# Altium footprint library Ixora.PcbLib: 191 footprints (part 6 of 12)
Each footprint in its own frame and in the unit in brackets; x right, y up, seen from the top. Pads: shape width x height; smd on the part's side, far side on the other; paste and mask are expansions set on the pad; w line width, h text height; cw(c..) or ccw(c..) is an arc to the next point about the centre after c.
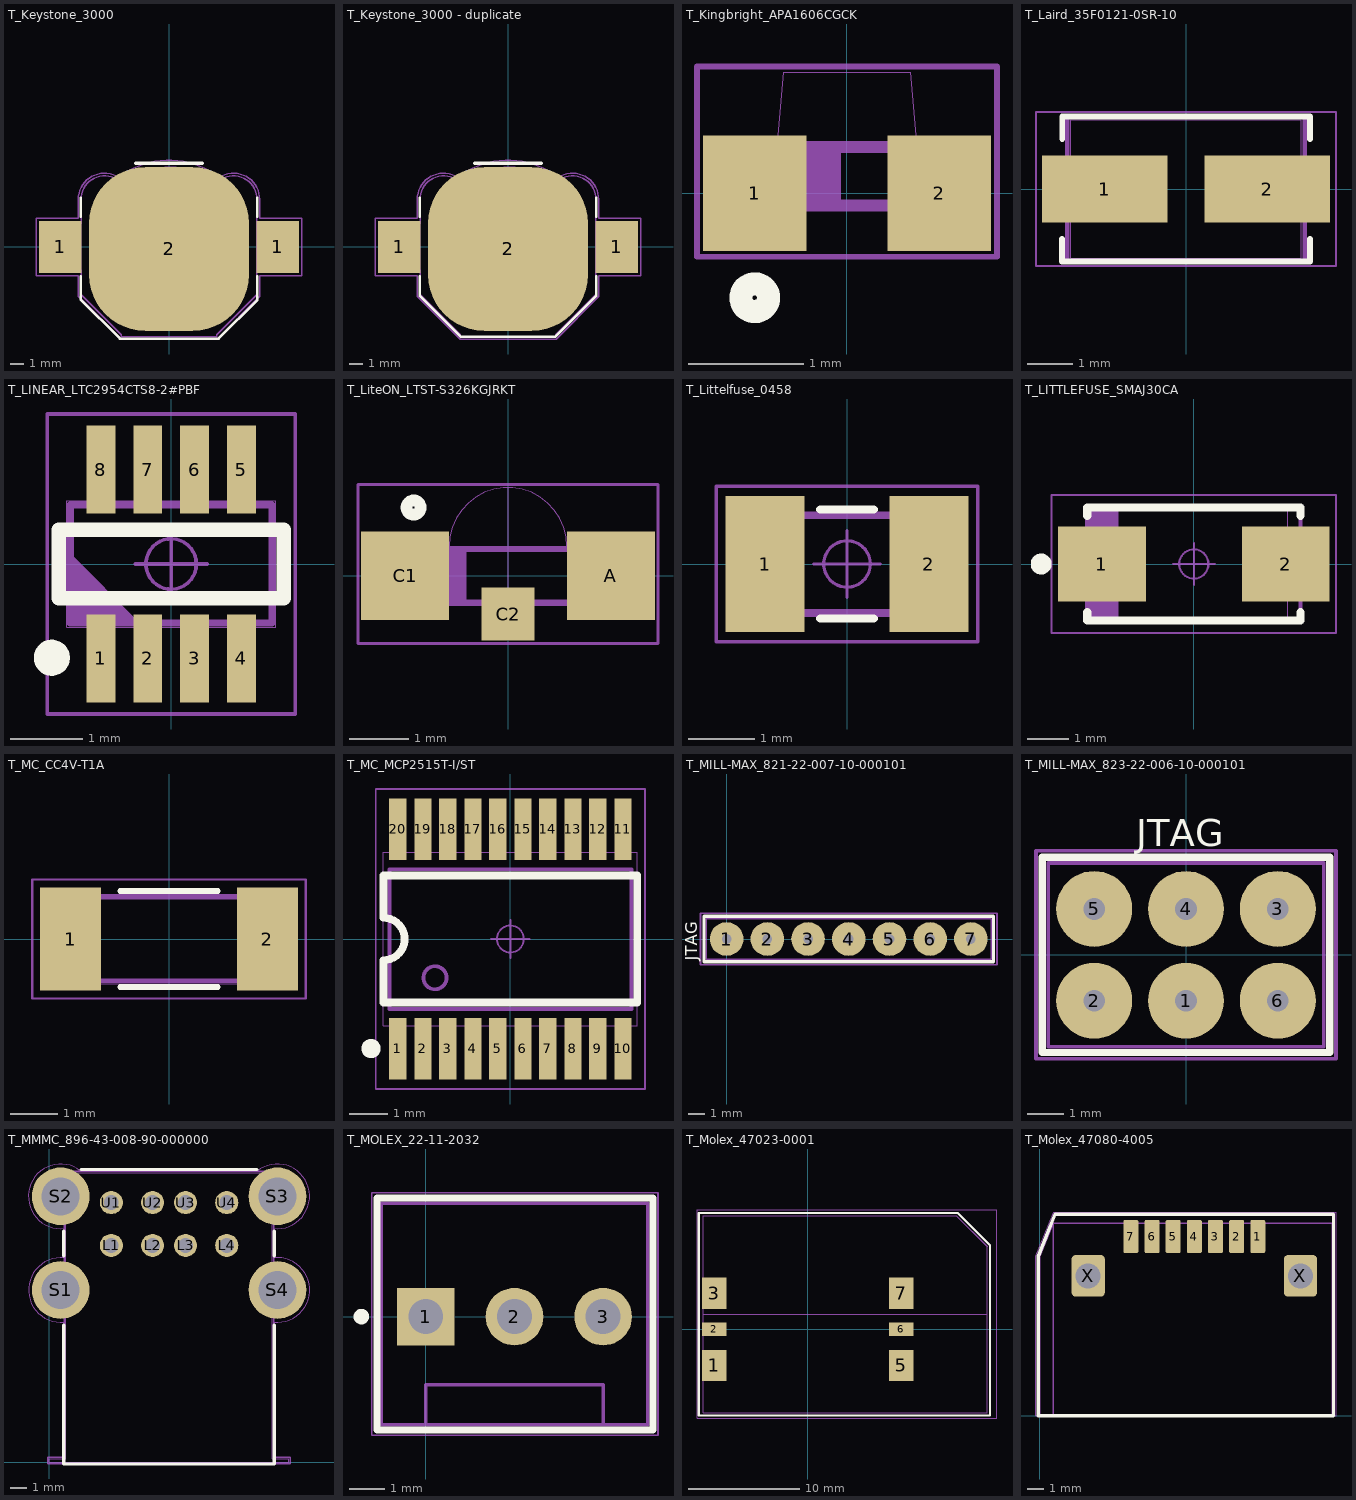
[diagram p5: the footprints below, top view; thin cyan lines are the x and y axes]

## T_Keystone_3000 [mm] "Battery Holder, 12mm (Dia)"
height 3.18
pads (3):
  rect 3.2x3.9 smd: 1(-8.17,0) 1(8.17,0)
  rrect70% 12x12.3 smd paste-11: 2(0,-0.15)
Top Overlay:
  lines w0.2: -6.631,-2.21 -6.631,-3.935 -3.683,-6.883 3.523,-6.883 3.734,-6.883 6.631,-3.986 6.631,-2.21 ; -6.631,2.261 -6.631,3.689 ; 6.631,2.261 6.631,3.689
  lines w0.254: -2.5,6.3 2.5,6.3
Mechanical 1:
  lines w0.1: -6.808,3.568 cw(c-4.849,3.588) -3.782,5.231 ; -6.808,3.588 -6.808,2.159 -9.982,2.159 -9.982,-2.159 -6.807,-2.159 -6.807,-3.683 -3.581,-6.909 3.607,-6.909 6.833,-3.683 6.833,-2.159 9.982,-2.159 9.982,2.159 6.809,2.159 6.809,3.57 ; -3.785,5.233 cw(c0,0.323) 3.785,5.233 ; 3.782,5.231 cw(c4.849,3.588) 6.807,3.568
Mechanical 2:
  circle w0.001: c0,0 r6
  circle w0.001: c8.185,0 r1.2
  circle w0.001: c-8.185,0 r1.2
  lines w0.001: -6.605,-1.585 -9.46,-1.585 -9.46,1.585 -6.605,1.585 ; -6.605,3.588 -6.605,-3.57 -6.59,-3.57 -3.57,-6.59 -3.57,-6.725 3.57,-6.725 3.57,-6.59 6.59,-3.57 6.605,-3.57 6.605,3.588 ; -6.605,3.57 cw(c-4.849,3.588) -3.585,4.808 ccw(c0,9.619) 3.586,4.808 cw(c4.849,3.588) 6.605,3.57 ; 6.605,-1.585 9.46,-1.585 9.46,1.585 6.605,1.585
Mechanical 3:
  lines w0.1: -6.605,-1.723 -6.605,-3.57 -6.59,-3.57 -3.57,-6.59 -3.57,-6.725 3.57,-6.725 3.57,-6.59 6.59,-3.57 6.605,-3.57 6.605,-1.723 ; -6.604,-1.723 -9.578,-1.723 -9.578,1.727 -6.605,1.727 -6.605,3.57 cw(c-4.849,3.588) -3.585,4.808 ccw(c0,9.619) 3.586,4.808 cw(c4.849,3.588) 6.605,3.57 ; 6.604,-1.724 9.575,-1.724 9.575,1.73 6.605,1.73 ; 6.605,1.727 6.605,3.57
3D body: height 3.16, standoff -0.01, extent -9.474,-6.923 9.474,5.142

## T_Keystone_3000 - duplicate [mm] "Battery Holder, 12mm (Dia)"
height 3.18
pads (3):
  rect 3.2x3.9 smd: 1(-8.17,0) 1(8.17,0)
  rrect70% 12x12.3 smd paste-11: 2(0,-0.15)
Top Overlay:
  lines w0.2: -6.631,-2.21 -6.631,-3.638 -3.517,-6.752 3.523,-6.752 3.523,-6.746 6.631,-3.638 6.631,-2.21 ; -6.631,2.261 -6.631,3.689 ; 6.631,2.261 6.631,3.689
  lines w0.254: -2.5,6.3 2.5,6.3
Mechanical 1:
  lines w0.1: -6.808,3.568 cw(c-4.849,3.588) -3.782,5.231 ; -6.808,3.588 -6.808,2.159 -9.982,2.159 -9.982,-2.159 -6.807,-2.159 -6.807,-3.683 -3.581,-6.909 3.607,-6.909 6.833,-3.683 6.833,-2.159 9.982,-2.159 9.982,2.159 6.809,2.159 6.809,3.57 ; -3.785,5.233 cw(c0,0.323) 3.785,5.233 ; 3.782,5.231 cw(c4.849,3.588) 6.807,3.568
Mechanical 2:
  circle w0.001: c-8.185,0 r1.2
  circle w0.001: c8.185,0 r1.2
  circle w0.001: c0,0 r6
  lines w0.001: -6.605,-1.585 -9.46,-1.585 -9.46,1.585 -6.605,1.585 ; -6.605,3.588 -6.605,-3.57 -6.59,-3.57 -3.57,-6.59 -3.57,-6.725 3.57,-6.725 3.57,-6.59 6.59,-3.57 6.605,-3.57 6.605,3.588 ; -6.605,3.57 cw(c-4.849,3.588) -3.585,4.808 ccw(c0,9.619) 3.586,4.808 cw(c4.849,3.588) 6.605,3.57 ; -3.57,5.345 3.57,5.345 ; 6.605,-1.585 9.46,-1.585 9.46,1.585 6.605,1.585
Mechanical 3:
  lines w0.1: -6.605,-1.723 -6.605,-3.57 -6.59,-3.57 -3.57,-6.59 -3.57,-6.725 3.57,-6.725 3.57,-6.59 6.59,-3.57 6.605,-3.57 6.605,-1.723 ; -6.604,-1.723 -9.578,-1.723 -9.578,1.727 -6.605,1.727 -6.605,3.57 cw(c-4.849,3.588) -3.585,4.808 ccw(c0,9.619) 3.586,4.808 cw(c4.849,3.588) 6.605,3.57 ; 6.604,-1.724 9.575,-1.724 9.575,1.73 6.605,1.73 ; 6.605,1.727 6.605,3.57
3D body: height 3.16, standoff -0.01, extent -9.474,-6.72 9.474,5.345

## T_Kingbright_APA1606CGCK [mm] "LED Kingbright APA1606CGCK Green"
height 0.6
pads (2):
  rect 0.9x1 smd: 1(-0.8,0) 2(0.8,0)
Top Overlay:
  circle w0.2: c-0.8,-0.905 r0.12
Mechanical 1:
  lines w0.05: -1.3,-0.55 1.3,-0.55 1.3,1.1 -1.3,1.1 -1.3,-0.55
Mechanical 2:
  lines w0.01: -0.6,0.45 -0.55,1.05 0.55,1.05 0.6,0.45 ; -0.9,-0.15 0.9,-0.15 0.9,0.45 -0.9,0.45 -0.9,-0.15
Mechanical 3:
  lines w0.1: -0.7,-0.105 -0.7,0.4 ; -0.6,-0.105 -0.6,0.4 ; -0.5,-0.105 -0.5,0.4 ; -0.4,-0.105 -0.4,0.4 ; -0.3,-0.105 -0.3,0.4 ; -0.2,-0.105 -0.2,0.4 ; -0.1,-0.105 -0.1,0.4 ; -0.8,-0.105 0.8,-0.105 0.8,0.4 -0.8,0.4 ; -0.8,-0.105 -0.8,0.4 ; -0.8,-0.105 -0.8,0.4
3D body: height 0.55, standoff 0, extent -0.6,0.45 0.6,1.05
3D body: height 0.6, standoff 0, extent -0.9,-0.15 0.9,0.45

## T_Laird_35F0121-0SR-10 [mm] "Power supply FB 10A"
height 3.05
pads (2):
  rect 2.77x1.47 smd: 1(-1.79,0) 2(1.79,0)
Top Overlay:
  lines w0.127: -2.732,-1.102 -2.732,-1.599 2.73,-1.599 2.73,-1.104 ; -2.729,1.104 -2.729,1.599 2.73,1.599 2.73,1.104
Mechanical 1:
  lines w0.05: -3.306,-1.695 -3.306,1.695 3.305,1.695 3.305,-1.695 -3.306,-1.695
Mechanical 2:
  lines w0.001: -2.54,-1.525 -2.54,1.525 2.54,1.525 2.54,-1.525 -2.54,-1.525
Mechanical 3:
  lines w0.1: -2.614,-1.599 2.614,-1.599 2.614,1.599 -2.614,1.599 -2.614,-1.599
3D body: height 3.05, standoff 0, extent -2.54,-1.525 2.54,1.525

## T_LINEAR_LTC2954CTS8-2#PBF [mm]
height 1
pads (8):
  rect 0.4x1.22 smd: 1(-0.975,-1.31) 2(-0.325,-1.31) 3(0.325,-1.31) 4(0.975,-1.31) 5(0.975,1.31) 6(0.325,1.31) 7(-0.325,1.31) 8(-0.975,1.31)
Top Overlay:
  circle w0.25: c-1.655,-1.3 r0.125
  lines w0.2: -1.56,-0.475 1.56,-0.475 1.56,0.475 -1.56,0.475 -1.56,-0.475
Mechanical 1:
  circle w0.05: c0,0 r0.35
  lines w0.05: -1.72,-2.08 1.72,-2.08 ; -1.72,-2.07 -1.72,2.08 1.72,2.08 1.72,-2.07 ; -0.5,0 0.5,0 ; 0,-0.5 0,0.5
Mechanical 2:
  lines w0.001: -1.45,-0.875 -1.45,0.875 1.45,0.875 1.45,-0.875 -1.45,-0.875
Mechanical 3:
  lines w0.1: -1.4,-0.72 -1.3,-0.82 ; -1.4,-0.62 -1.2,-0.82 ; -1.4,-0.52 -1.1,-0.82 ; -1.4,-0.42 -1,-0.82 ; -1.4,-0.32 -0.9,-0.82 ; -1.4,-0.22 -0.8,-0.82 ; -1.4,-0.12 -0.7,-0.82 ; -1.4,-0.02 -0.6,-0.82 ; -1.4,0.08 -0.5,-0.82 ; -1.4,-0.82 1.4,-0.82 1.4,0.82 -1.4,0.82 -1.4,-0.82
3D body: height 1, standoff 0, extent -1.45,-0.875 1.45,0.875

## T_LiteON_LTST-S326KGJRKT [mm] "LED LiteON LTST-S326KGJRKT Red Green"
height 1
pads (3):
  rect 1.5x1.5 smd: A(1.75,0) C1(-1.75,0)
  rect 0.9x0.9 smd: C2(0,-0.65)
Top Overlay:
  circle w0.2: c-1.605,1.16 r0.12
Mechanical 1:
  lines w0.05: -2.55,-1.15 2.55,-1.15 2.55,1.55 -2.55,1.55 -2.55,-1.15
Mechanical 2:
  lines w0.01: -1,0.5 cw(c0,0.5) 1,0.5 ; 0,-0.5 0,1.5 ; -1.5,-0.5 1.5,-0.5 1.5,0.5 -1.5,0.5 -1.5,-0.5
Mechanical 3:
  lines w0.1: -1.355,-0.455 -1.355,0.455 ; -1.255,-0.455 -1.255,0.455 ; -1.155,-0.455 -1.155,0.455 ; -1.055,-0.455 -1.055,0.455 ; -0.955,-0.455 -0.955,0.455 ; -0.855,-0.455 -0.855,0.455 ; -0.755,-0.455 -0.755,0.455 ; -1.455,-0.455 -1.455,0.455 ; -1.455,-0.455 -1.455,0.455 ; -1.455,-0.455 1.455,-0.455 1.455,0.455 -1.455,0.455
3D body: height 0.9, standoff 0, extent 0,0.5 1,1.5
3D body: height 1, standoff 0, extent 0,-0.5 1.5,0.5
3D body: height 0.9, standoff 0, extent -1,0.5 0,1.5
3D body: height 1, standoff 0, extent -1.5,-0.5 0,0.5

## T_Littelfuse_0458 [mm] "Fast Fuse"
height 1.575
pads (2):
  rect 1.185x2.05 smd: 1(-1.232,0) 2(1.232,0)
Top Overlay:
  lines w0.127: -0.4,-0.82 0.4,-0.82 ; -0.4,0.82 0.4,0.82
Mechanical 1:
  circle w0.05: c0,0 r0.35
  lines w0.05: -0.5,0 0.5,0 ; 0,-0.5 0,0.5 ; -1.97,-1.17 -1.97,1.17 1.97,1.17 1.97,-1.17 -1.97,-1.17
Mechanical 2:
  lines w0.01: -0.685,-0.787 -0.685,0.787 ; 0.685,-0.787 0.685,0.787 ; -1.587,-0.787 -1.587,0.787 1.587,0.787 1.587,-0.787 -1.587,-0.787
Mechanical 3:
  lines w0.1: -1.53,-0.73 -1.53,0.73 1.53,0.73 1.53,-0.73 -1.53,-0.73
3D body: height 1.58, standoff 0, extent -1.587,-0.787 -0.795,0.79
3D body: height 1.4, standoff 0, extent -0.795,-0.68 0.795,0.68
3D body: height 1.58, standoff 0, extent 0.795,-0.79 1.587,0.787

## T_LITTLEFUSE_SMAJ30CA [mm] "Bidirectional ESD protection"
height 2.29
pads (2):
  rect 2.1x1.8 smd: 1(-2.2,0) 2(2.2,0)
Top Overlay:
  circle w0.25: c-3.65,0 r0.125
  lines w0.2: -2.55,-1.15 -2.55,-1.35 2.55,-1.35 2.55,-1.15 ; -2.55,1.15 -2.55,1.35 2.55,1.35 2.55,1.15
Mechanical 1:
  circle w0.05: c0,0 r0.35
  lines w0.05: -0.5,0 0.5,0 ; 0,-0.5 0,0.5 ; -3.4,-1.65 3.4,-1.65 3.4,1.65 -3.4,1.65 -3.4,-1.65
Mechanical 2:
  lines w0.001: -2.25,-1.395 2.25,-1.395 2.25,1.395 -2.25,1.395 -2.25,-1.395
Mechanical 3:
  lines w0.1: -2.452,-1.332 -2.452,1.332 ; -2.352,-1.332 -2.352,1.332 ; -2.252,-1.332 -2.252,1.332 ; -2.152,-1.332 -2.152,1.332 ; -2.052,-1.332 -2.052,1.332 ; -1.952,-1.332 -1.952,1.332 ; -1.852,-1.332 -1.852,1.332 ; -2.552,-1.332 2.552,-1.332 2.552,1.332 -2.552,1.332 ; -2.552,-1.332 -2.552,1.332 ; -2.552,-1.332 -2.552,1.332
3D body: height 2.29, standoff 0, extent -2.25,-1.395 2.25,1.395

## T_MC_CC4V-T1A [mm]
height 0.9
pads (2):
  rect 1.3x2.2 smd: 1(-2.1,0) 2(2.1,0)
Top Overlay:
  lines w0.127: -1.04,-1.02 1.04,-1.02 ; -1.04,1.02 1.04,1.02
Mechanical 1:
  lines w0.05: -2.92,-1.27 2.92,-1.27 2.92,1.27 -2.92,1.27 -2.92,-1.27
Mechanical 2:
  lines w0.001: -2.5,-0.95 2.5,-0.95 2.5,0.95 -2.5,0.95 -2.5,-0.95
Mechanical 3:
  lines w0.1: -2.44,-0.89 -2.44,0.89 2.44,0.89 2.44,-0.89 -2.44,-0.89
3D body: height 2.29, standoff 0, extent -2.5,-0.95 2.5,0.95

## T_MC_MCP2515T-I/ST [mm] "TSSOP20"
height 1.2
pads (20):
  rect 0.45x1.6 smd: 1(-2.925,-2.85) 2(-2.275,-2.85) 3(-1.625,-2.85) 4(-0.975,-2.85) 5(-0.325,-2.85) 6(0.325,-2.85) 7(0.975,-2.85) 8(1.625,-2.85) 9(2.275,-2.85) 10(2.925,-2.85) 11(2.925,2.85) 12(2.275,2.85) 13(1.625,2.85) 14(0.975,2.85) 15(0.325,2.85) 16(-0.325,2.85) 17(-0.975,2.85) 18(-1.625,2.85) 19(-2.275,2.85) 20(-2.925,2.85)
Top Overlay:
  circle w0.25: c-3.625,-2.85 r0.125
  lines w0.2: -3.3,-1.65 -3.3,-0.55 ccw(c-3.3,0) -3.3,0.55 -3.3,1.65 3.3,1.65 3.3,-1.65 -3.3,-1.65
Mechanical 1:
  circle w0.05: c0,0 r0.35
  lines w0.05: -0.5,0 0.5,0 ; 0,-0.5 0,0.5 ; -3.5,-3.9 -3.5,3.9 3.5,3.9 3.5,-3.9 -3.5,-3.9
Mechanical 2:
  lines w0.001: -3.3,-2.25 -3.3,2.25 3.3,2.25 3.3,-2.25 -3.3,-2.25
Mechanical 3:
  circle w0.1: c-1.961,-1.008 r0.3
  lines w0.1: -3.143,-1.817 -3.143,1.815 3.147,1.815 3.147,-1.817 -3.143,-1.817
3D body: height 1.2, standoff 0, extent -3.3,-2.25 3.3,2.25

## T_MILL-MAX_821-22-007-10-000101 [mm] "Pogo Pins"
height 3.48
pads (7):
  round 2.1 hole 0.6: 1(0,0) 2(2.54,0) 3(5.08,0) 4(7.62,0) 5(10.16,0) 6(12.7,0) 7(15.24,0)
Top Overlay:
  lines w0.2: -1.42,-1.42 -1.42,1.42 16.66,1.42 16.66,-1.42 -1.42,-1.42
  text "JTAG" at -1.85,-1.35 h0.75
Mechanical 1:
  lines w0.1: -1.63,-1.6 -1.63,1.6 16.87,1.6 16.87,-1.6 -1.63,-1.6
Mechanical 2:
  lines w0.01: -1.27,-1.27 16.51,-1.27 16.51,1.27 -1.27,1.27 -1.27,-1.27
Mechanical 3:
  lines w0.1: -1.27,-1.27 -1.27,1.27 16.51,1.27 16.51,-1.27 -1.27,-1.27
3D body: height 3.5, standoff -1.74, extent -1.27,-1.27 16.51,1.27

## T_MILL-MAX_823-22-006-10-000101 [mm] "Pogo Pins"
height 3.48
pads (6):
  round 2.1 hole 0.6: 1(0,-1.27) 2(-2.54,-1.27) 3(2.54,1.27) 4(0,1.27) 5(-2.54,1.27) 6(2.54,-1.27)
Top Overlay:
  lines w0.2: -3.975,-2.7 -3.975,2.7 3.975,2.7 3.975,-2.7 -3.975,-2.7
  text "JTAG" at -1.375,3 h0.75
Mechanical 1:
  lines w0.1: -4.15,-2.875 -4.15,2.875 4.15,2.875 4.15,-2.875 -4.15,-2.875
Mechanical 2:
  lines w0.001: -3.81,-2.54 -3.81,2.54 3.81,2.54 3.81,-2.54 -3.81,-2.54
Mechanical 3:
  lines w0.1: -3.81,-2.54 -3.81,2.54 3.81,2.54 3.81,-2.54 -3.81,-2.54
3D body: height 3.5, standoff -1.74, extent -3.81,-2.54 3.81,2.54

## T_MMMC_896-43-008-90-000000 [mm] "USB 2.0 double row, Type A"
height 15.6
pads (12):
  round 1.4 hole 0.9: L1(3.75,13.13) L2(6.25,13.13) L3(8.25,13.13) L4(10.75,13.13) U1(3.75,15.73) U2(6.25,15.73) U3(8.25,15.73) U4(10.75,15.73)
  round 3.5 hole 2.3: S1(0.68,10.43) S2(0.68,16.11) S3(13.82,16.11) S4(13.82,10.43)
Top Overlay:
  lines w0.2: 0.875,8.3 0.875,-0.12 13.625,-0.12 13.625,8.3 ; 0.875,12.5 0.875,14 ; 1.91,17.73 12.58,17.73 ; 13.625,12.5 13.625,14
Mechanical 1:
  lines w0.05: 0.901,8.484 0.901,0.299 -0.099,0.299 -0.099,-0.099 14.599,-0.099 14.599,0.299 13.599,0.299 13.599,8.485 ; 0.901,12.374 0.901,14.164 ; 0.902,8.484 cw(c0.685,10.429) 0.904,12.374 ; 0.903,14.164 cw(c0.679,16.109) 1.895,17.643 1.91,17.628 12.582,17.628 ; 12.582,17.631 cw(c13.815,16.11) 13.598,14.165 ; 13.599,12.375 13.599,14.165 ; 13.599,12.376 cw(c13.815,10.43) 13.6,8.485
Mechanical 2:
  lines w0.001: 0,0 14.5,0 14.5,0.2 13.5,0.2 13.5,17.53 1,17.53 1,0.2 0,0.2 0,0
Mechanical 3:
  lines w0.1: 0.9,0.299 0.9,17.629 13.599,17.629 13.599,0.299 14.6,0.299 14.6,-0.099 -0.099,-0.099 -0.099,0.299 0.901,0.299
3D body: height 16.17, standoff -3.58, extent -0.45,0 14.95,17.53

## T_MOLEX_22-11-2032 [mm] "Connector; Header; 3 Position with Friction Lock"
height 10
pads (3):
  rect 1.65x1.65 hole 1: 1(0,0)
  round 1.65 hole 1: 2(2.54,0) 3(5.08,0)
Top Overlay:
  circle w0.254: c-1.845,0 r0.095
  lines w0.2: -1.4,-3.25 6.5,-3.25 6.5,3.4 -1.4,3.4 -1.4,-3.25
Mechanical 1:
  lines w0.05: -1.55,-3.4 6.65,-3.4 6.65,3.55 -1.55,3.55 -1.55,-3.4
Mechanical 2:
  lines w0.001: -1.27,-3.099 6.35,-3.099 6.35,3.251 -1.27,3.251 -1.27,-3.099
Mechanical 3:
  lines w0.1: 0,-3.099 0,-1.955 5.08,-1.955 5.08,-3.099 ; -1.27,-3.099 6.35,-3.099 6.35,3.251 -1.27,3.251 -1.27,-3.099
3D body: height 10.68, standoff -3.54, extent -1.27,-3.099 6.35,3.251

## T_Molex_47023-0001 [mm] "6 Contacts Mini Sim Card Holder"
height 1.9
pads (6):
  rect 2.2x2.8 smd: 1(-8.4,-3.24) 3(-8.4,3.24) 5(8.4,-3.24) 7(8.4,3.24)
  rect 2.2x1.2 smd: 2(-8.4,0) 6(8.4,0)
Top Overlay:
  lines w0.2: -9.8,-7.74 16.375,-7.74 16.375,7.56 13.485,10.45 -9.8,10.45 -9.8,-7.74
Mechanical 1:
  lines w0.05: -9.955,-7.975 -9.955,10.725 17,10.725 17,-7.975 -9.955,-7.975
Mechanical 2:
  lines w0.01: -9.4,1.36 16.12,1.36 ; -9.4,-7.49 -9.4,10.21 13.35,10.21 16.12,7.44 16.12,-7.49 -9.4,-7.49
Mechanical 3:
  lines w0.1: -9.4,-7.49 16.12,-7.49 16.12,7.435 13.345,10.21 -9.4,10.21 -9.4,-7.49
3D body: height 1.97, standoff 0.02, extent -9.4,-7.49 16.115,10.21

## T_Molex_47080-4005 [mm] "SATA Connector SMD"
height 5.85
pads (9):
  rrect25% 0.9x2 smd: 1(13.08,10.76) 2(11.81,10.76) 3(10.54,10.76) 4(9.27,10.76) 5(8,10.76) 6(6.73,10.76) 7(5.46,10.76)
  rrect25% 2x2.5 hole 1.5: X(2.9,8.4) X(15.64,8.4)
Top Overlay:
  lines w0.2: -0.1,0 -0.1,9.585 0.903,12.095 17.625,12.095 17.625,0 -0.1,0
Mechanical 1:
  lines w0.05: -0.235,0 -0.235,9.576 0.819,12.215 17.775,12.215 17.775,0 -0.235,0
Mechanical 2:
  lines w0.001: 0.8,0 0.8,11.56 ; 0.8,11.56 0,9.56 0,0 17.54,0 17.54,11.56 0.8,11.56
Mechanical 3:
  lines w0.1: 0.8,0 0.8,11.56 ; 0.8,11.56 17.54,11.56 17.54,0 0,0 0,9.56 0.8,11.56
3D body: height 5.87, standoff -2.58, extent 0,0 17.54,11.56